# Altium footprint library Lib.PcbLib: 177 footprints (part 7 of 12)
Each footprint in its own frame and in the unit in brackets; x right, y up, seen from the top. Pads: shape width x height; smd on the part's side, far side on the other; paste and mask are expansions set on the pad; w line width, h text height; cw(c..) or ccw(c..) is an arc to the next point about the centre after c.
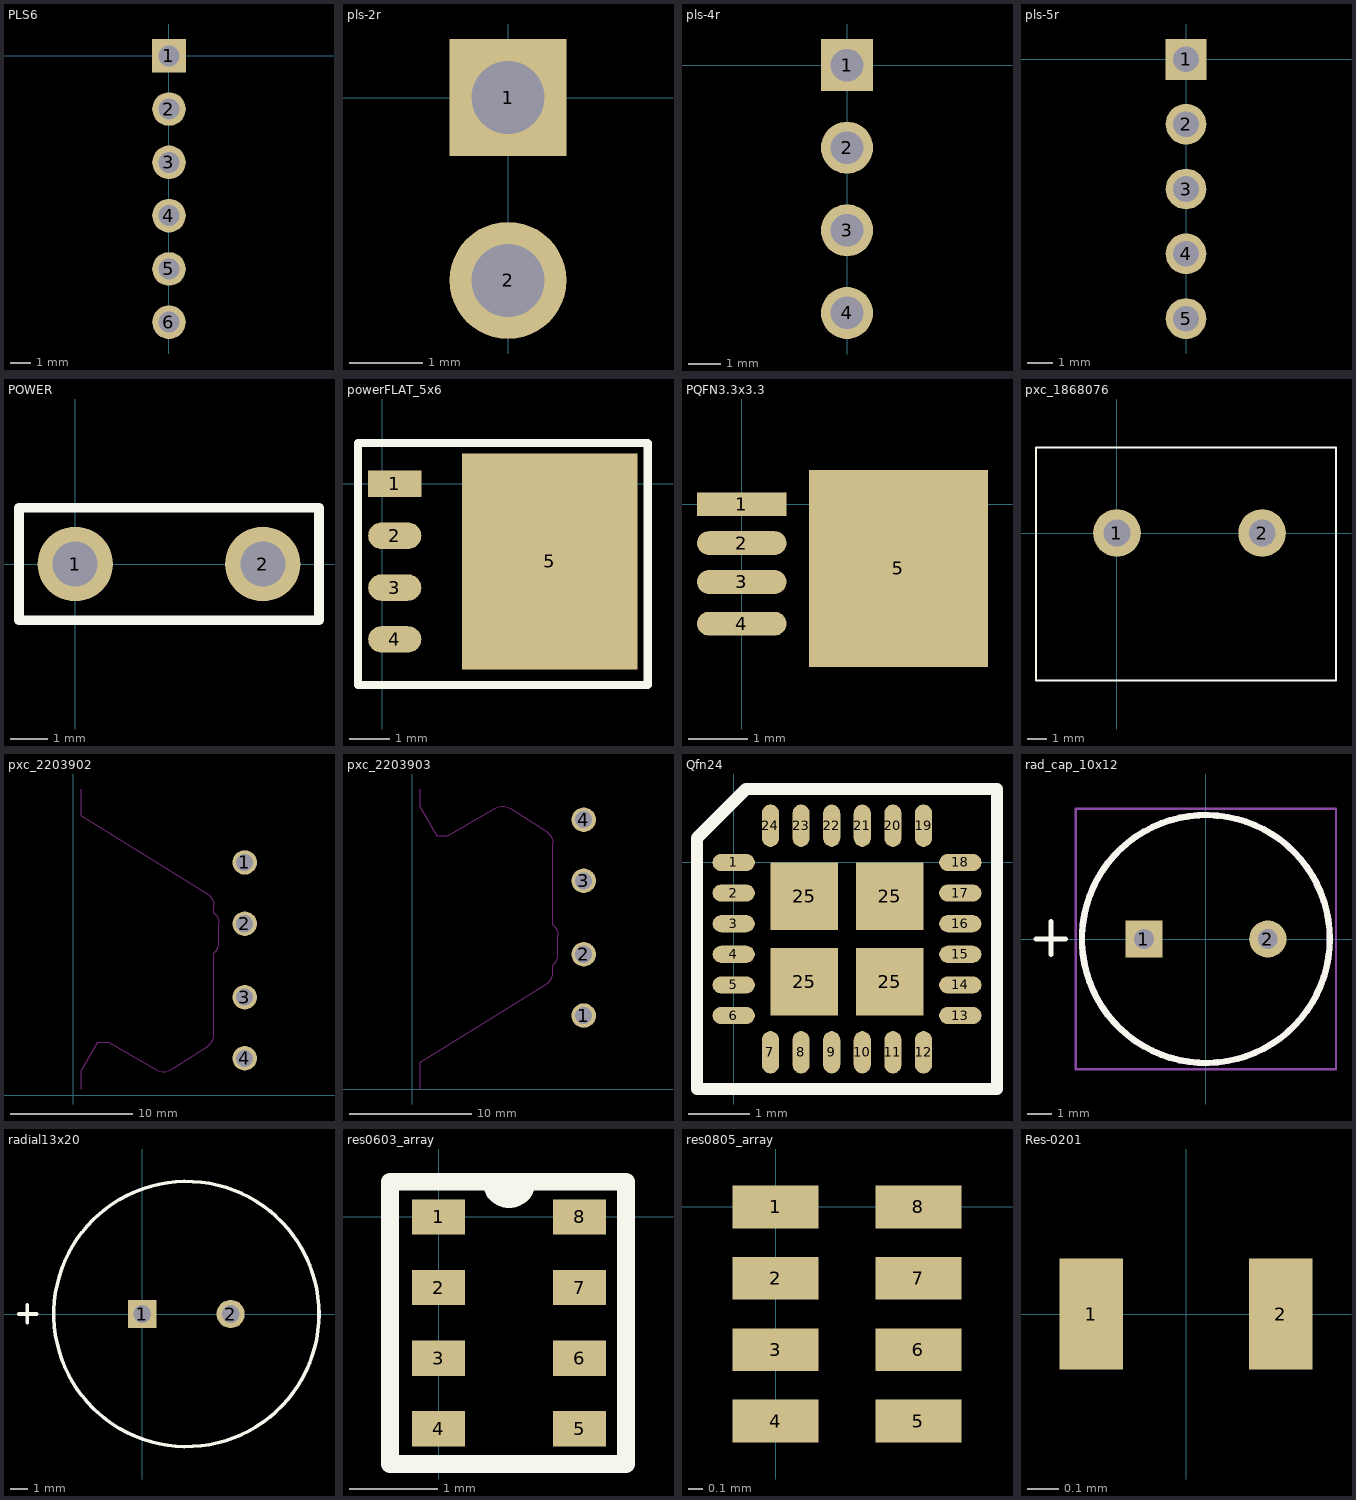
[diagram p6: the footprints below, top view; thin cyan lines are the x and y axes]

## PLS6 [mm]
pads (6):
  rect 1.6x1.6 hole 1: 1(0,0)
  round 1.6 hole 1: 2(0,-2.54) 3(0,-5.08) 4(0,-7.62) 5(0,-10.16) 6(0,-12.7)
3D body "User Library-PLS-6-1.step": height 8.54, standoff -3, extent -1.19,-14.02 1.35,1.22

## pls-2r [mm]
pads (2):
  rect 1.6x1.6 hole 1: 1(0,0)
  round 1.6 hole 1: 2(0,-2.5)
3D body "User Library-PLS-2R gold.step": height 5.45, standoff -3, extent -1.27,-3.77 7.35,1.31

## pls-4r [mm]
pads (4):
  rect 1.6x1.6 hole 1: 1(0,0)
  round 1.6 hole 1: 2(0,-2.54) 3(0,-5.08) 4(0,-7.62)
3D body "User Library-PLS-4R gold.step": height 3.02, standoff -5.6, extent -0.45,-8.89 8,1.27

## pls-5r [mm]
pads (5):
  rect 1.6x1.6 hole 1: 1(0,0)
  round 1.6 hole 1: 2(0,-2.54) 3(0,-5.08) 4(0,-7.62) 5(0,-10.16)
3D body "User Library-PLS-5R.step": height 2.54, standoff -2.54, extent -0.254,-11.43 9.195,1.27

## POWER [mm]
pads (2):
  round 2 hole 1.2: 1(0,0) 2(5,0)
Top Overlay:
  lines w0.254: -1.5,-1.5 -1.5,1.5 6.5,1.5 6.5,-1.5 -1.5,-1.5

## powerFLAT_5x6 [mm]
pads (5):
  rect 1.3x0.65 smd: 1(0.3,0)
  oval 1.3x0.65 smd: 2(0.3,-1.27) 3(0.3,-2.54) 4(0.3,-3.81)
  rect 4.3x5.3 smd: 5(4.1,-1.9)
Top Overlay:
  lines w0.2: -0.6,-4.925 6.5,-4.925 6.5,1 -0.6,1 -0.6,-4.925
3D body "User Library-Power_Flat.STEP": height 0.95, standoff -0.04, extent -0.025,-4.525 6.125,0.675

## PQFN3.3x3.3 [mm]
pads (5):
  rect 1.5x0.4 smd: 1(0,0)
  oval 1.5x0.4 smd: 2(0,-0.65) 3(0,-1.3) 4(0,-2)
  rect 3x3.3 smd: 5(2.625,-1.075)
3D body "User Library-PQFN 3x3.STEP": height 1, standoff 0, extent -0.085,-2.5 2.945,0.5

## pxc_1868076 [mm]
pads (2):
  round 2.5 hole 1.4: 1(0,0) 2(7.62,0)
Top Overlay:
  lines w0.1: -4.25,-7.75 11.5,-7.75 11.5,4.5 -4.25,4.5 -4.25,-7.75
3D body "pxc_1868076_04_MKDS-5-2-7-62_3D.stp": height 21.5, standoff -5, extent -4.305,-7.9 11.505,4.6

## pxc_2203902 [mm]
pads (4):
  round 2 hole 1.4: 1(14,19) 2(14,14) 3(14,8) 4(14,3)
Keep-Out Layer:
  lines w0.1: 0.65,0.5 0.65,2 2,4.3 2.9,4.3 6.771,2.064 7.009,1.958 7.265,1.907 7.526,1.913 7.78,1.974 8.014,2.089 10.943,3.947 11.132,4.095 11.288,4.279 11.404,4.49 11.476,4.72 11.5,4.96 11.5,11.606 11.669,11.792 11.795,12.01 11.874,12.25 11.9,12.5 11.9,14 11.874,14.25 11.795,14.49 11.669,14.708 11.5,14.894 11.5,15.431 11.475,15.673 11.402,15.906 11.283,16.119 11.124,16.303 10.93,16.452 0.65,22.8 0.65,25
3D body "ICC25-H-4L5.0__01080961_H.Select.stp": height 3.75, standoff -21.25, extent -4.128,1.499 16.218,23.899

## pxc_2203903 [mm]
pads (4):
  round 2 hole 1.4: 1(14,6) 2(14,11) 3(14,17) 4(14,22)
Keep-Out Layer:
  lines w0.1: 0.65,0 0.65,2.2 10.93,8.548 11.124,8.697 11.283,8.881 11.402,9.094 11.475,9.327 11.5,9.569 11.5,10.106 11.669,10.292 11.795,10.51 11.874,10.75 11.9,11 11.9,12.5 11.874,12.75 11.795,12.99 11.669,13.208 11.5,13.394 11.5,20.04 11.476,20.28 11.404,20.51 11.288,20.721 11.132,20.905 10.943,21.053 8.014,22.911 7.78,23.026 7.526,23.087 7.265,23.093 7.009,23.042 6.771,22.936 2.9,20.7 2,20.7 0.65,23 0.65,24.5
3D body "ICC25-H-4R5.0__01083879_H.Select.stp": height 20.75, standoff -4.25, extent -4.18,0.986 16.165,23.386

## Qfn24 [mm]
pads (28):
  oval 0.69x0.28 smd: 1(0,0) 2(0,-0.5) 3(0,-1) 4(0,-1.5) 5(0,-2) 6(0,-2.5) 13(3.7,-2.5) 14(3.7,-2) 15(3.7,-1.5) 16(3.7,-1) 17(3.7,-0.5) 18(3.7,0)
  oval 0.28x0.69 smd: 7(0.6,-3.1) 8(1.1,-3.1) 9(1.6,-3.1) 10(2.1,-3.1) 11(2.6,-3.1) 12(3.1,-3.1) 19(3.1,0.6) 20(2.6,0.6) 21(2.1,0.6) 22(1.6,0.6) 23(1.1,0.6) 24(0.6,0.6)
  rect 1.1x1.1 smd: 25(1.15,-1.95) 25(1.15,-0.55) 25(2.55,-1.95) 25(2.55,-0.55)
Top Overlay:
  lines w0.2: -0.6,-3.7 -0.6,0.4 0.2,1.2 4.3,1.2 4.3,-3.7 -0.6,-3.7
3D body "User Library-QFN24_4x4.STEP": height 1, standoff 0, extent -0.16,-3.21 3.86,0.81

## rad_cap_10х12 [mm]
height 102
pads (2):
  rect 1.5x1.5 hole 0.8: 1(-2.5,0)
  round 1.5 hole 0.8: 2(2.5,0)
Top Overlay:
  circle w0.254: c0,0 r5
  lines w0.2: -6.85,0 -5.65,0 ; -6.25,-0.625 -6.25,0.7
Mechanical 3:
  circle w0.254: c0,0 r5
  text ".Designator" at -3.125,6.5 h1.52
Mechanical 15:
  lines w0.1: -5.25,-5.25 -5.25,5.25 5.25,5.25 5.25,-5.25 -5.25,-5.25
3D body "User Library-Cap electrolitic radial 10x12.STEP": height 12.3, standoff -1.2, extent -4.998,-4.999 4.998,4.998

## radial13x20 [mm]
pads (2):
  rect 1.6x1.6 hole 1: 1(0,0)
  round 1.6 hole 1: 2(5,0)
Top Overlay:
  circle w0.2: c2.5,0 r7.5
  lines w0.2: -6.968,0 -5.952,0 ; -6.5,-0.5 -6.5,0.516
3D body "User Library-Cap electrolitic radial 13x20.STEP": height 20.8, standoff -0.7, extent -3.998,-6.499 8.998,6.499

## res0603_array [mm]
pads (8):
  rect 0.6x0.4 smd: 1(0,0) 2(0,-0.8) 3(0,-1.6) 4(0,-2.4) 5(1.6,-2.4) 6(1.6,-1.6) 7(1.6,-0.8) 8(1.6,0)
Top Overlay:
  lines w0.2: -0.55,-2.8 2.125,-2.8 2.125,0.4 0.6,0.4 ccw(c0.8,0.4) 1,0.4 -0.55,0.4 -0.55,-2.8
3D body "User Library-Array-1206-4Way-Var1.STEP": height 0.5, standoff 0, extent 0,-2.825 1.6,0.375

## res0805_array [mm]
pads (8):
  rect 0.6x0.3 smd: 1(0,0) 2(0,-0.5) 3(0,-1) 4(0,-1.5) 5(1,-1.5) 6(1,-1) 7(1,-0.5) 8(1,0)
3D body "User Library-YC124-1.step": height 0.45, standoff 0, extent 0.025,-1.75 1.025,0.25

## Res-0201 [mm]
pads (2):
  rect 0.2x0.35 smd: 1(-0.3,0) 2(0.3,0)
3D body "User Library-RES_0603-0201.STEP": height 0.34, standoff 0, extent -0.34,-0.165 0.34,0.165